# Altium footprint library 9-Pcblib_Con.PcbLib: 266 footprints (part 8 of 17)
Each footprint in its own frame and in the unit in brackets; x right, y up, seen from the top. Pads: shape width x height; smd on the part's side, far side on the other; paste and mask are expansions set on the pad; w line width, h text height; cw(c..) or ccw(c..) is an arc to the next point about the centre after c.
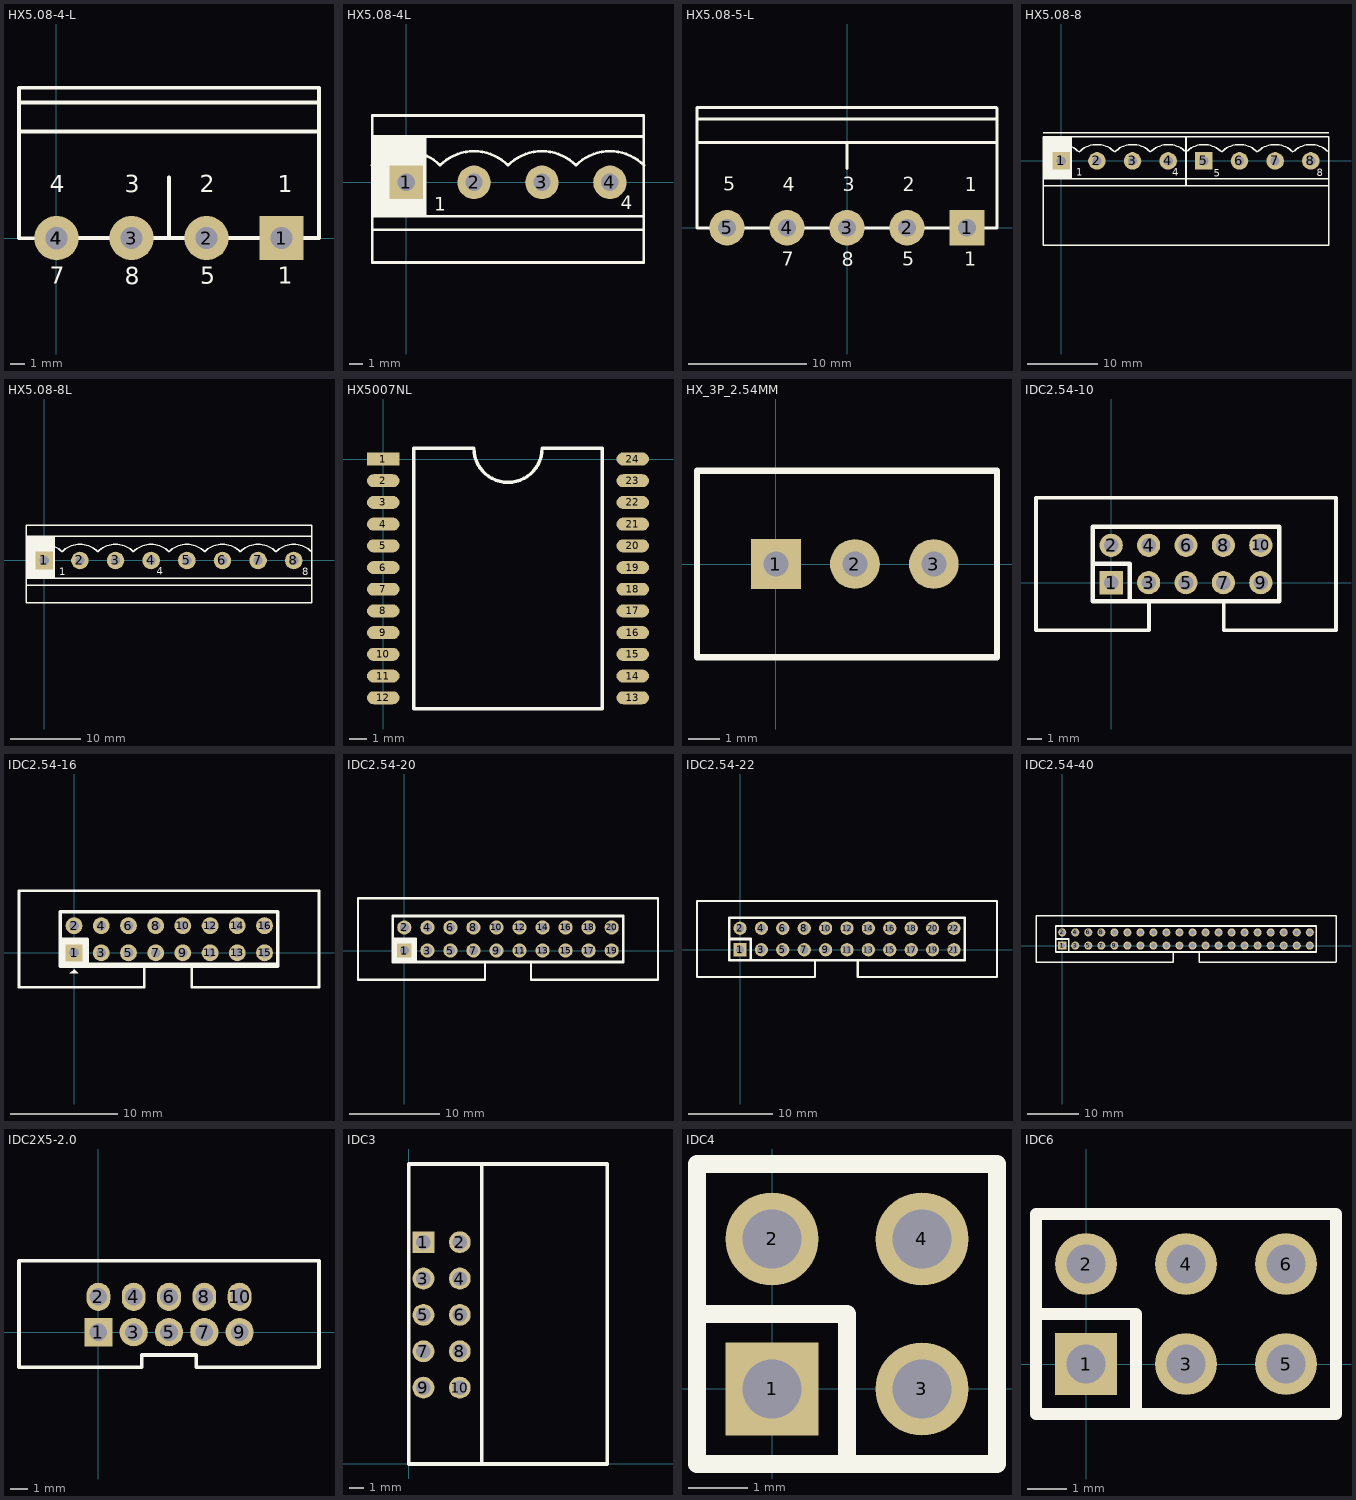
[diagram p7: the footprints below, top view; thin cyan lines are the x and y axes]

## HX5.08-4-L [mm]
height 8
pads (5):
  rect 3x3 hole 1.5: 1(15.248,0.012)
  round 3 hole 1.5: 2(10.168,0.012) 3(5.088,0.012) 4(0,0) 4(0.008,0.012)
Top Overlay:
  lines w0.254: -2.476,9.195 17.788,9.195 ; -2.444,7.239 17.788,7.239 ; 0,0 -2.54,0 -2.54,10.2 17.74,10.2 ; 0.008,0.012 17.788,0.012 17.788,10.172 ; 2.54,0 5.08,0 ; 7.62,0.051 7.62,4.115
  text "1" at 14.986,2.718 h2
  text "2" at 9.703,2.718 h2
  text "3" at 4.623,2.718 h2
  text "4" at -0.457,2.718 h2
  text "5" at 9.754,-3.48 h2
  text "1" at 14.986,-3.505 h2
  text "7" at -0.457,-3.505 h2
  text "8" at 4.623,-3.531 h2

## HX5.08-4L [mm]
pads (4):
  rect 2.5x2.5 hole 1.3: 1(0,0)
  round 2.5 hole 1.3: 2(5.08,0) 3(10.16,0) 4(15.24,0)
Top Overlay:
  rectangle: -2.54,-2.54 1.524,3.429
  lines w0.203: -2.544,1.274 cw(c0,-1.27) 2.544,1.274 ; -2.54,-3.556 17.78,-3.556 ; -2.54,-2.54 17.78,-2.54 ; -2.54,3.429 17.78,3.429 ; 2.536,1.274 cw(c5.08,-1.27) 7.624,1.274 ; 7.616,1.274 cw(c10.16,-1.27) 12.704,1.274 ; 12.696,1.274 cw(c15.24,-1.27) 17.784,1.274 ; -2.54,-6 -2.54,5 17.78,5 17.78,-6 -2.54,-6
  text "1" at 2.108,-2.108 h1.02
  text "4" at 16.053,-2.032 h1.02
3D body: height 12, standoff -3.6, extent -3.246,-4.445 18.994,3.905

## HX5.08-5-L [mm]
height 8
pads (5):
  rect 3x3 hole 1.5: 1(10.16,0)
  round 3 hole 1.5: 2(5.08,0) 3(0,0) 4(-5.08,0) 5(-10.16,0)
Top Overlay:
  lines w0.254: -12.7,7.2 12.612,7.2 ; -12.7,9.2 12.644,9.2 ; 0,5 0,7.2 ; 12.66,10.2 -12.7,10.2 -12.7,0 -10.16,0 -5.08,0 12.7,0 12.7,10.16
  text "8" at -0.457,-3.632 h2
  text "7" at -5.537,-3.607 h2
  text "1" at 9.906,-3.607 h2
  text "5" at 4.674,-3.581 h2
  text "5" at -10.465,2.743 h2
  text "4" at -5.461,2.718 h2
  text "3" at -0.381,2.718 h2
  text "2" at 4.699,2.718 h2
  text "1" at 9.982,2.718 h2

## HX5.08-8 [mm]
pads (8):
  rect 2.5x2.5 hole 1.3: 1(0,0) 5(20.316,0)
  round 2.5 hole 1.3: 2(5.08,0) 3(10.16,0) 4(15.24,0) 6(25.4,0) 7(30.48,0) 8(35.56,0)
Top Overlay:
  rectangle: -2.54,-2.54 1.524,3.429
  lines w0.203: -2.544,1.274 cw(c0,-1.27) 2.544,1.274 ; -2.54,-3.556 17.78,-3.556 17.78,3.429 -2.54,3.429 -2.54,-12 38.1,-12 38.1,3.429 ; -2.54,-2.54 17.78,-2.54 ; -2.54,4 38.1,4 ; 2.536,1.274 cw(c5.08,-1.27) 7.624,1.274 ; 7.616,1.274 cw(c10.16,-1.27) 12.704,1.274 ; 12.696,1.274 cw(c15.24,-1.27) 17.784,1.274 ; 17.771,1.274 cw(c20.316,-1.27) 22.86,1.274 ; 17.776,-2.54 38.096,-2.54 ; 22.851,1.274 cw(c25.396,-1.27) 27.94,1.274 ; 27.931,1.274 cw(c30.476,-1.27) 33.02,1.274 ; 33.011,1.274 cw(c35.556,-1.27) 38.1,1.274 ; 38.096,-3.556 17.776,-3.556 17.776,3.429 38.096,3.429
  text "1" at 2.108,-2.108 h1.02
  text "4" at 15.824,-2.108 h1.02
  text "5" at 21.717,-2.261 h1.02
  text "8" at 36.424,-2.21 h1.02

## HX5.08-8L [mm]
pads (8):
  rect 2.5x2.5 hole 1.3: 1(0,0)
  round 2.5 hole 1.3: 2(5.08,0) 3(10.16,0) 4(15.24,0) 5(20.32,0) 6(25.4,0) 7(30.48,0) 8(35.56,0)
Top Overlay:
  rectangle: -2.54,-2.54 1.524,3.429
  lines w0.203: -2.544,1.274 cw(c0,-1.27) 2.544,1.274 ; -2.54,-3.556 38.1,-3.556 ; -2.54,-2.54 38.1,-2.54 ; -2.54,3.429 38.1,3.429 ; 2.536,1.274 cw(c5.08,-1.27) 7.624,1.274 ; 7.616,1.274 cw(c10.16,-1.27) 12.704,1.274 ; 12.696,1.274 cw(c15.24,-1.27) 17.784,1.274 ; 17.776,1.274 cw(c20.32,-1.27) 22.864,1.274 ; 22.856,1.274 cw(c25.4,-1.27) 27.944,1.274 ; 27.936,1.274 cw(c30.48,-1.27) 33.024,1.274 ; 33.016,1.274 cw(c35.56,-1.27) 38.104,1.274 ; -2.54,-6 38.1,-6 38.1,5 -2.54,5 -2.54,-6
  text "8" at 36.779,-2.083 h1.02
  text "4" at 16.053,-2.032 h1.02
  text "1" at 2.108,-2.108 h1.02

## HX5007NL [mm]
pads (24):
  rect 1.9x0.76 smd: 1(0,0)
  oval 1.9x0.76 smd: 2(0,-1.27) 3(0,-2.54) 4(0,-3.81) 5(0,-5.08) 6(0,-6.35) 7(0,-7.62) 8(0,-8.89) 9(0,-10.16) 10(0,-11.43) 11(0,-12.7) 12(0,-13.97) 13(14.6,-13.97) 14(14.6,-12.7) 15(14.6,-11.43) 16(14.6,-10.16) 17(14.6,-8.89) 18(14.6,-7.62) 19(14.6,-6.35) 20(14.6,-5.08) 21(14.6,-3.81) 22(14.6,-2.54) 23(14.6,-1.27) 24(14.6,0)
Top Overlay:
  lines w0.2: 1.785,-14.605 1.785,0.635 5.3,0.635 ccw(c7.3,0.635) 9.3,0.635 12.815,0.635 12.815,-14.605 1.785,-14.605

## HX_3P_2.54MM [mm]
pads (3):
  rect 1.6x1.6 hole 0.8: 1(0,0)
  round 1.6 hole 0.8: 2(2.54,0) 3(5.08,0)
Top Overlay:
  lines w0.2: 7.089,-3 -2.54,-3 -2.54,3 7.089,3 ; 7.112,-3 7.112,3

## IDC2.54-10 [mil]
pads (10):
  rect 62x62 hole 39.37: 1(0,0)
  round 62 hole 39.37: 2(0,100) 3(100,0) 4(100,100) 5(200,0) 6(200,100) 7(300,0) 8(300,100) 9(400,0) 10(400,100)
Top Overlay:
  lines w10: 101,-50 101,-127.17 -201.18,-127.17 -201.18,227.16 601.18,227.16 ; 301,-50 301,-127.17 601.18,-127.17 ; 601,-127.33 601,227
  lines w12: -50,50 50,50 50,-50 ; -50,-50 -50,150 450,150 450,-50 -50,-50
3D body: height 388, standoff -120, extent -198,-130 602,230

## IDC2.54-16 [mil]
pads (16):
  rect 62x62 hole 35.43: 1(0,0)
  round 62 hole 35.43: 2(0,100) 3(100,0) 4(100,100) 5(200,0) 6(200,100) 7(300,0) 8(300,100) 9(400,0) 10(400,100) 11(500,0) 12(500,100) 13(600,0) 14(600,100) 15(700,0) 16(700,100)
Top Overlay:
  rectangle: -51,-49 48,53
  region: -15,-75 15,-75 0,-60
  lines w7.87: -50,-40 750,-40
  lines w10: 258,-49 258,-126.17 -202.18,-126.17 -202.18,228.16 900.18,228.16 900.18,-126.17 433,-126.17 433,-49
  lines w12: -51,51 49,51 49,-49 ; -51,-49 -51,151 749,151 749,-49 -51,-49

## IDC2.54-20 [mil]
pads (20):
  rect 62x62 hole 39.37: 1(0,0)
  round 62 hole 39.37: 2(0,100) 3(100,0) 4(100,100) 5(200,0) 6(200,100) 7(300,0) 8(300,100) 9(400,0) 10(400,100) 11(500,0) 12(500,100) 13(600,0) 14(600,100) 15(700,0) 16(700,100) 17(800,0) 18(800,100) 19(900,0) 20(900,100)
Top Overlay:
  rectangle: -50,-50 49,52
  lines w10: 350,-50 350,-127.17 -201.18,-127.17 -201.18,227.16 1101.18,227.16 1101.18,-127.17 550,-127.17 550,-50
  lines w12: -50,50 50,50 50,-50 ; -50,-50 -50,150 950,150 950,-50 -50,-50
3D body: height 352.36, standoff -114.17, extent -201,-123.27 1099,235

## IDC2.54-22 [mil]
pads (22):
  rect 62x62 hole 39.37: 1(0,0)
  round 62 hole 39.37: 2(0,100) 3(100,0) 4(100,100) 5(200,0) 6(200,100) 7(300,0) 8(300,100) 9(400,0) 10(400,100) 11(500,0) 12(500,100) 13(600,0) 14(600,100) 15(700,0) 16(700,100) 17(800,0) 18(800,100) 19(900,0) 20(900,100) 21(1000,0) 22(1000,100)
Top Overlay:
  lines w10: 350,-50 350,-127.17 -201.18,-127.17 -201.18,227.16 1201.18,227.16 1201.18,-127.17 550,-127.17 550,-50
  lines w12: -50,50 50,50 50,-50 ; -50,-50 -50,150 1050,150 1050,-50 -50,-50

## IDC2.54-40 [mil]
pads (40):
  rect 62x62 hole 39.37: 1(0,0)
  round 62 hole 39.37: 2(0,100) 3(100,0) 4(100,100) 5(200,0) 6(200,100) 7(300,0) 8(300,100) 9(400,0) 10(400,100) 11(500,0) 12(500,100) 13(600,0) 14(600,100) 15(700,0) 16(700,100) 17(800,0) 18(800,100) 19(900,0) 20(900,100) 21(1000,0) 22(1000,100) 23(1100,0) 24(1100,100) 25(1200,0) 26(1200,100) 27(1300,0) 28(1300,100) 29(1400,0) 30(1400,100) 31(1500,0) 32(1500,100) 33(1600,0) 34(1600,100) 35(1700,0) 36(1700,100) 37(1800,0) 38(1800,100) 39(1900,0) 40(1900,100)
Top Overlay:
  lines w10: 851,-50 851,-127.17 -201.18,-127.17 -201.18,227.16 2101.18,227.16 2101.18,-127.17 ; 1051,-50 1051,-127.17 2101,-127.17
  lines w12: -50,50 50,50 50,-50 ; 1948,-50 -50,-50 -50,150 1950,150 ; 1950,50 1950,-50 ; 1950,-50 1950,150 ; 1950,-50 1950,150
3D body: height 366.14, standoff -98.43, extent -196.64,-126.08 2098.64,244

## IDC2X5-2.0 [mm]
pads (10):
  rect 1.6x1.6 hole 1: 1(0,0)
  oval 1.35x1.6 hole 1: 2(0,2) 4(2,2) 6(4,2) 8(6,2) 10(8,2)
  round 1.6 hole 1: 3(2,0) 5(4,0) 7(6,0) 9(8,0)
Top Overlay:
  lines w0.2: -4.5,-1.98 -4.5,4.039 12.5,4.039 12.5,-1.982 ; -4.46,-1.98 2.464,-1.981 2.464,-1.295 5.537,-1.295 5.537,-1.98 12.497,-1.981

## IDC3 [mil]
pads (10):
  rect 60x60 hole 40: 1(40,610)
  round 60 hole 40: 2(140,610) 3(40,510) 4(140,510) 5(40,410) 6(140,410) 7(40,310) 8(140,310) 9(40,210) 10(140,210)
Top Overlay:
  lines w10: 200,5 200,825 ; 543.31,0 0,0 0,825 543.31,825 ; 545,0 545,825

## IDC4 [mil]
pads (4):
  rect 62x62 hole 39.37: 1(0,0)
  round 62 hole 39.37: 2(0,100) 3(100,0) 4(100,100)
Top Overlay:
  lines w12: -50,50 50,50 50,-50 ; -50,-50 -50,150 150,150 150,-50 -50,-50

## IDC6 [mil]
pads (6):
  rect 62x62 hole 39.37: 1(0,0)
  round 62 hole 39.37: 2(0,100) 3(100,0) 4(100,100) 5(200,0) 6(200,100)
Top Overlay:
  lines w12: -50,50 50,50 50,-50 ; -50,-50 250,-50 250,150 -50,150 -50,-50